# Altium footprint library 2.00-DIP-SOP、SOIC、ESOP、TSSOP、ETSSOP封装.PcbLib: 179 footprints (part 4 of 12)
Each footprint in its own frame and in the unit in brackets; x right, y up, seen from the top. Pads: shape width x height; smd on the part's side, far side on the other; paste and mask are expansions set on the pad; w line width, h text height; cw(c..) or ccw(c..) is an arc to the next point about the centre after c.
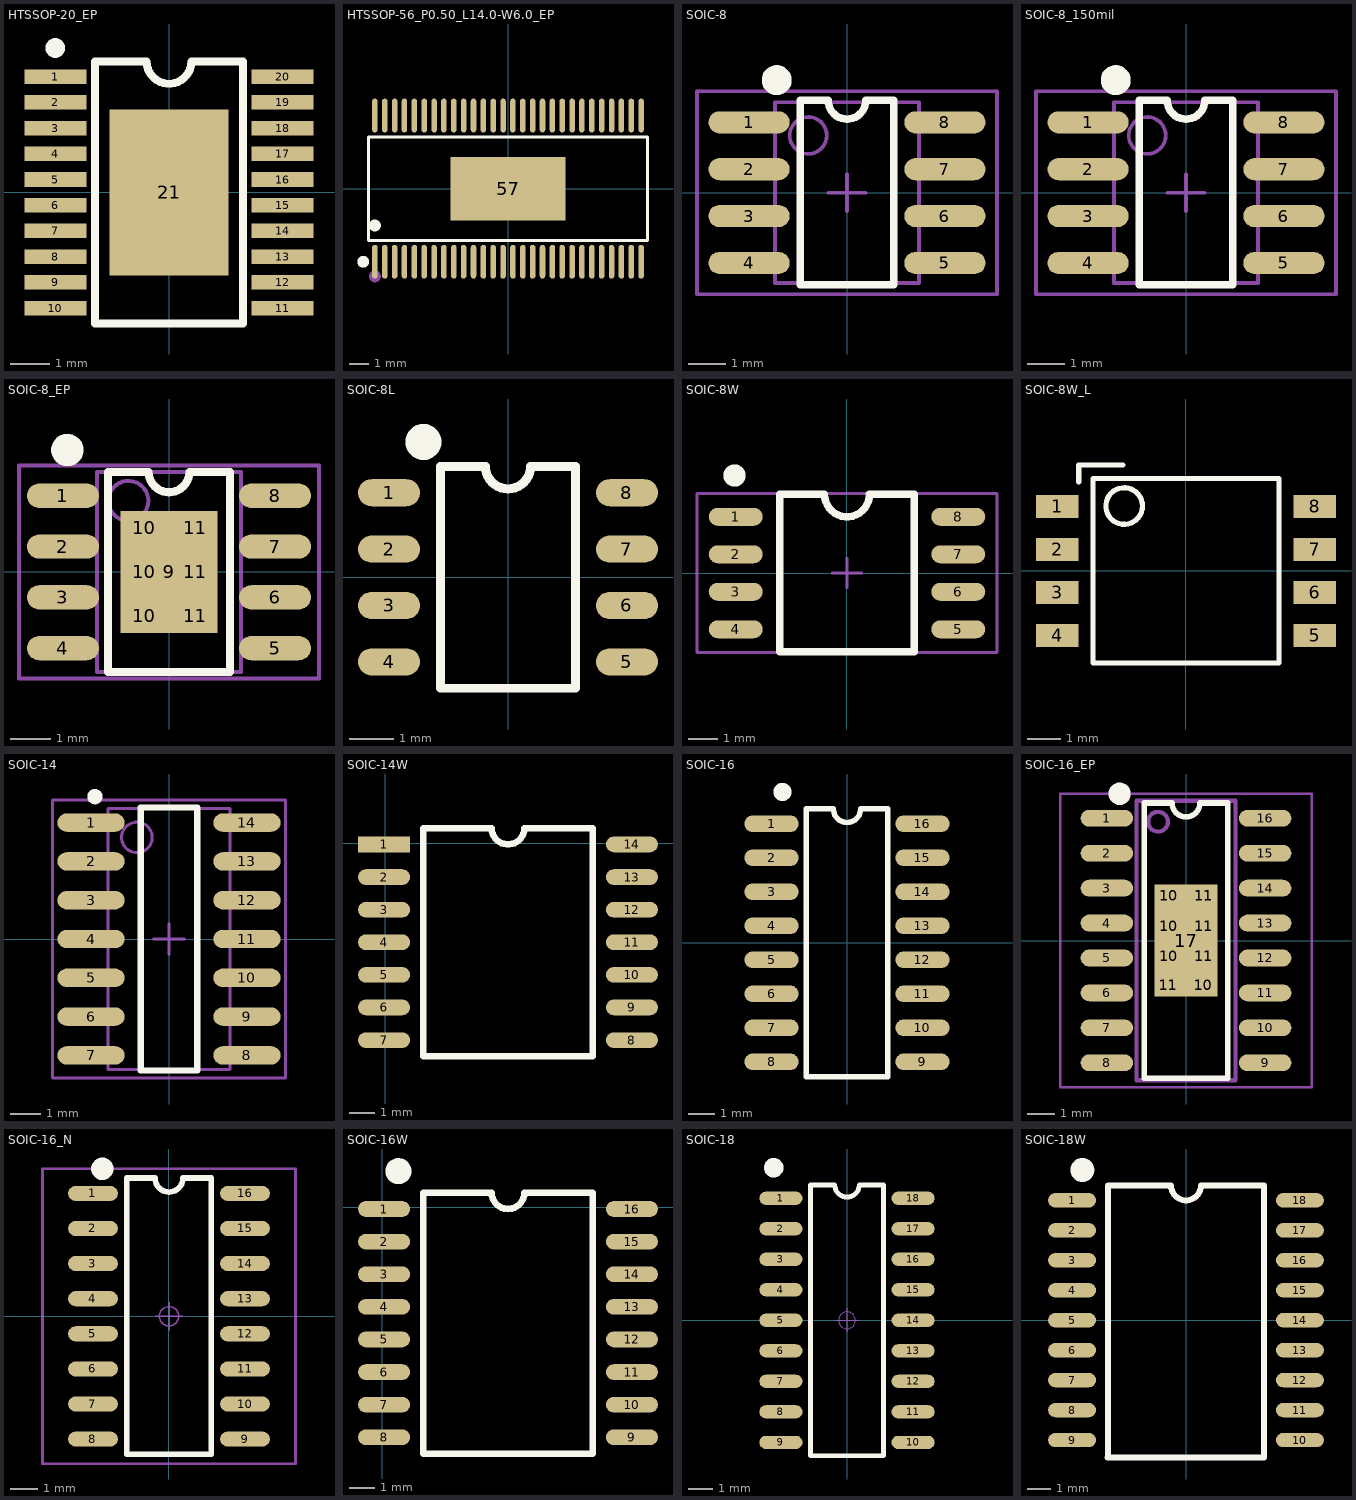
[diagram p3: the footprints below, top view; thin cyan lines are the x and y axes]

## HTSSOP-20_EP [mil] "HTSSOP-20_L6.5-W4.4-P0.65-LS6.4-BL-EP"
pads (21):
  rect 61.5x14.5 smd: 1(-113,115.16) 2(-113,89.57) 3(-113,63.98) 4(-113,38.39) 5(-113,12.8) 6(-113,-12.79) 7(-113,-38.39) 8(-113,-63.98) 9(-113,-89.57) 10(-113,-115.16) 11(113,-115.16) 12(113,-89.57) 13(113,-63.98) 14(113,-38.39) 15(113,-12.79) 16(113,12.8) 17(113,38.39) 18(113,63.98) 19(113,89.57) 20(113,115.16)
  rect 118.11x165.35 smd: 21(0,0)
Top Overlay:
  lines w7.9: -73.47,-130.31 -73.47,130.32 -22.28,130.32 ccw(c0,130.31) 22.3,130.32 73.48,130.32 73.48,-130.31 -73.47,-130.31
  lines w9.8: -108.3,143.6 cw(c-113.2,143.65) -108.3,143.7
3D body "TSSOP20.STEP": height 40.55, standoff -0.76, extent -126.06,-127.95 126.07,127.96

## HTSSOP-56_P0.50_L14.0-W6.0_EP [mm] "联系卖家 免费查找封装"
pads (57):
  oval 0.28x1.715 smd: 1(-6.75,-3.707) 2(-6.25,-3.707) 3(-5.75,-3.707) 4(-5.25,-3.707) 5(-4.75,-3.707) 6(-4.25,-3.707) 7(-3.75,-3.707) 8(-3.25,-3.707) 9(-2.75,-3.707) 10(-2.25,-3.707) 11(-1.75,-3.707) 12(-1.25,-3.707) 13(-0.75,-3.707) 14(-0.25,-3.707) 15(0.25,-3.707) 16(0.75,-3.707) 17(1.25,-3.707) 18(1.75,-3.707) 19(2.25,-3.707) 20(2.75,-3.707) 21(3.25,-3.707) 22(3.75,-3.707) 23(4.25,-3.707) 24(4.75,-3.707) 25(5.25,-3.707) 26(5.75,-3.707) 27(6.25,-3.707) 28(6.75,-3.707) 29(6.75,3.708) 30(6.25,3.708) 31(5.75,3.708) 32(5.25,3.708) 33(4.75,3.708) 34(4.25,3.708) 35(3.75,3.708) 36(3.25,3.708) 37(2.75,3.708) 38(2.25,3.708) 39(1.75,3.708) 40(1.25,3.708) 41(0.75,3.708) 42(0.25,3.708) 43(-0.25,3.708) 44(-0.75,3.708) 45(-1.25,3.708) 46(-1.75,3.708) 47(-2.25,3.708) 48(-2.75,3.708) 49(-3.25,3.708) 50(-3.75,3.708) 51(-4.25,3.708) 52(-4.75,3.708) 53(-5.25,3.708) 54(-5.75,3.708) 55(-6.25,3.708) 56(-6.75,3.708)
  rect 5.825x3.235 smd: 57(0,0)
Top Overlay:
  circle w0.3: c-6.75,-1.869 r0.15
  circle w0.3: c-7.342,-3.708 r0.15
  lines w0.152: -7.076,-2.621 -7.076,2.622 7.076,2.622 7.076,-2.621 -7.076,-2.621
Mechanical 15:
  circle w0.3: c-6.75,-4.45 r0.15
3D body: height 1, standoff 0.1, extent -7,-2.6 7,2.6

## SOIC-8 [mm]
height 1.75
pads (8):
  oval 2.2x0.6 smd: 1(-2.654,1.905) 2(-2.654,0.635) 3(-2.654,-0.635) 4(-2.654,-1.905) 5(2.654,-1.905) 6(2.654,-0.635) 7(2.654,0.635) 8(2.654,1.905)
Top Overlay:
  circle w0.5: c-1.905,3.048 r0.155
  lines w0.2: -1.27,2.5 -1.27,-2.5 1.27,-2.5 1.27,2.5 ; -0.9,-2.5 0.9,-2.5
  lines w0.203: -1.27,2.5 -0.508,2.5 ccw(c0,2.5) 0,1.992 ccw(c0,2.5) 0.508,2.5 1.27,2.5
Mechanical 13:
  circle w0.1: c-1.05,1.55 r0.5
  lines w0.1: -1.95,-2.45 -1.95,2.45 1.95,2.45 1.95,-2.45 -1.95,-2.45
Mechanical 15:
  lines w0.1: -0.5,0 0.5,0 ; 0,-0.5 0,0.5 ; -4.064,-2.75 -4.064,2.75 4.064,2.75 4.064,-2.75 -4.064,-2.75
3D body "SOP8.STEP": height 1.9, standoff 0, extent -3.003,-2.5 3.003,2.5

## SOIC-8_150mil [mm] "封装库来自淘宝卖家 ID：黄晶宝石"
height 1.75
pads (8):
  oval 2.2x0.6 smd: 1(-2.654,1.905) 2(-2.654,0.635) 3(-2.654,-0.635) 4(-2.654,-1.905) 5(2.654,-1.905) 6(2.654,-0.635) 7(2.654,0.635) 8(2.654,1.905)
Top Overlay:
  circle w0.5: c-1.905,3.048 r0.155
  lines w0.2: -1.27,2.5 -1.27,-2.5 1.27,-2.5 1.27,2.5 ; -0.9,-2.5 0.9,-2.5
  lines w0.203: -1.27,2.5 -0.508,2.5 ccw(c0,2.5) 0,1.992 ccw(c0,2.5) 0.508,2.5 1.27,2.5
Mechanical 13:
  circle w0.1: c-1.05,1.55 r0.5
  lines w0.1: -1.95,-2.45 -1.95,2.45 1.95,2.45 1.95,-2.45 -1.95,-2.45
Mechanical 15:
  lines w0.1: -0.5,0 0.5,0 ; 0,-0.5 0,0.5 ; -4.064,-2.75 -4.064,2.75 4.064,2.75 4.064,-2.75 -4.064,-2.75
3D body "SOP8.STEP": height 1.9, standoff 0, extent -3.003,-2.5 3.003,2.5

## SOIC-8_EP [mm] "5*6*1.8mm（长宽高)         联系卖家 免费查找封装"
height 1.75
pads (15):
  oval 1.8x0.61 smd: 1(-2.65,1.905) 2(-2.65,0.635) 3(-2.65,-0.635) 4(-2.65,-1.905) 5(2.65,-1.905) 6(2.65,-0.635) 7(2.65,0.635) 8(2.65,1.905)
  rect 2.413x3.048 smd paste-2: 9(0,0)
  rect 0.9x0.7 on Top Paste: 10(-0.625,-1.1) 10(-0.625,0) 10(-0.625,1.1) 11(0.65,-1.1) 11(0.65,0) 11(0.65,1.1)
Top Overlay:
  circle w0.5: c-2.54,3.048 r0.155
  lines w0.2: -1.524,2.5 -1.524,-2.5 1.524,-2.5 1.524,2.5
  lines w0.203: -1.524,2.5 -0.508,2.5 ccw(c0,2.5) 0,1.992 ccw(c0,2.5) 0.508,2.5 1.524,2.5
Mechanical 13:
  circle w0.1: c-1.016,1.778 r0.5
  lines w0.1: -1.8,-2.5 1.8,-2.5 1.8,2.5 -1.8,2.5 -1.8,-2.5
Mechanical 15:
  circle w0.05: c0,0 r0.35
  lines w0.05: -0.5,0 0.5,0 ; 0,-0.5 0,0.5
  lines w0.1: -3.75,-2.667 -3.75,2.667 3.75,2.667 3.75,-2.667 -3.75,-2.667
3D body "ESOP8.STEP": height 1.53, standoff -0.01, extent -3.003,-2.5 3.003,2.5

## SOIC-8L [mm] "联系卖家 免费查找封装"
pads (8):
  oval 1.397x0.61 smd: 1(-2.68,1.905) 2(-2.68,0.635) 3(-2.68,-0.635) 4(-2.68,-1.905) 5(2.68,-1.905) 6(2.68,-0.635) 7(2.68,0.635) 8(2.68,1.905)
Top Overlay:
  circle w0.5: c-1.905,3.048 r0.155
  lines w0.2: -1.524,2.5 -1.524,-2.5 1.524,-2.5 1.524,2.5 ; -0.9,-2.5 0.9,-2.5
  lines w0.203: -1.524,2.5 -0.508,2.5 ccw(c0,2.5) 0,1.992 ccw(c0,2.5) 0.508,2.5 1.524,2.5
3D body "SOP8.STEP": height 1.9, standoff 0, extent -3.003,-2.5 3.003,2.5

## SOIC-8W [mil] "25Q128 SPI_FLASH  SOIC8"
height 68.9
pads (8):
  oval 72x24 smd: 1(-148.35,75) 2(-148.35,25) 3(-148.35,-25) 4(-148.35,-75) 5(148.35,-75) 6(148.35,-25) 7(148.35,25) 8(148.35,75)
Top Overlay:
  circle w9.84: c-149.92,125 r4.92
  circle w19.68: c-150,130 r5
  lines w10: -90,-105 90,-105 90,105 30,105 cw(c0,105) -30,105 -90,105 -90,-105
Mechanical 15:
  lines w3.94: -19.68,0 19.69,0 ; 0,-19.68 0,19.68 ; -200,-106.3 -200,106.3 200,106.3 200,-106.3 -200,-106.3
3D body "SOP8E .STEP": height 74.8, standoff 0.03, extent -155.22,-103.93 155.23,103.94

## SOIC-8W_L [mm] "25Q128 SPI_FLASH  SOIC8  联系卖家 免费查找封装"
pads (8):
  rect 1.25x0.68 smd: 1(-3.805,1.905) 2(-3.805,0.635) 3(-3.805,-0.635) 4(-3.805,-1.905) 5(3.805,-1.905) 6(3.805,-0.635) 7(3.805,0.635) 8(3.805,1.905)
Top Overlay:
  circle w0.152: c-1.826,1.915 r0.541
  lines w0.152: -3.167,2.63 -3.167,3.13 -1.867,3.13 ; -2.75,-2.725 -2.75,2.725 2.75,2.725 2.75,-2.725 -2.75,-2.725
3D body "SOP8E .STEP": height 1.9, standoff 0, extent -3.943,-2.64 3.943,2.64

## SOIC-14 [mm] "联系卖家 免费查找封装"
height 1.75
pads (14):
  oval 2.2x0.6 smd: 1(-2.552,3.81) 2(-2.552,2.54) 3(-2.552,1.27) 4(-2.552,0) 5(-2.552,-1.27) 6(-2.552,-2.54) 7(-2.552,-3.81) 8(2.552,-3.81) 9(2.552,-2.54) 10(2.552,-1.27) 11(2.552,0) 12(2.552,1.27) 13(2.552,2.54) 14(2.552,3.81)
Top Overlay:
  circle w0.25: c-2.425,4.66 r0.125
  lines w0.2: -0.925,-4.3 0.925,-4.3 0.925,4.3 -0.925,4.3 -0.925,-4.3
Mechanical 13:
  circle w0.1: c-1.05,3.325 r0.5
  lines w0.1: -2,-4.275 2,-4.275 2,4.275 -2,4.275 -2,-4.275
Mechanical 15:
  lines w0.1: -0.5,0 0.5,0 ; 0,-0.5 0,0.5 ; -3.81,-4.55 3.81,-4.55 3.81,4.55 -3.81,4.55 -3.81,-4.55
3D body "SOP-14.STEP": height 1.9, standoff 0, extent -3.003,-4.35 3.003,4.35

## SOIC-14W [mil] "联系卖家 免费查找封装"
pads (14):
  rect 80x24 smd: 1(-2,-2)
  oval 80x24 smd: 2(-2,-52) 3(-2,-102) 4(-2,-152) 5(-2,-202) 6(-2,-252) 7(-2,-302) 8(378,-302) 9(378,-252) 10(378,-202) 11(378,-152) 12(378,-102) 13(378,-52) 14(378,-2)
Top Overlay:
  lines w10: 58,-327 318,-327 318,23 213,23 cw(c188,23) 163,23 58,23 58,-327

## SOIC-16 [mil] "联系卖家 免费查找封装"
pads (16):
  oval 80x24 smd: 1(-110.95,175) 2(-110.95,125) 3(-110.95,75) 4(-110.95,25) 5(-110.95,-25) 6(-110.95,-75) 7(-110.95,-125) 8(-110.95,-175) 9(110.95,-175) 10(110.95,-125) 11(110.95,-75) 12(110.95,-25) 13(110.95,25) 14(110.95,75) 15(110.95,125) 16(110.95,175)
Top Overlay:
  circle w18: c-95,221.81 r4.3
  lines w7.87: -60,196.85 -60,-196.85 60,-196.85 60,196.85
  lines w8: -60,196.85 -20,196.85 ccw(c0,196.85) 0,176.85 ccw(c0,196.85) 20,196.85 60,196.85
3D body "SOP16.STEP": height 74.8, standoff 0.03, extent -118.21,-196.85 118.23,196.86

## SOIC-16_EP [mm] "10.3*6.2*1.8mm（长宽高）联系卖家 免费查找封装"
height 1.75
pads (25):
  oval 1.905x0.61 smd: 1(-2.877,4.445) 2(-2.877,3.175) 3(-2.877,1.905) 4(-2.877,0.635) 5(-2.877,-0.635) 6(-2.877,-1.905) 7(-2.877,-3.175) 8(-2.877,-4.445) 9(2.877,-4.445) 10(2.877,-3.175) 11(2.877,-1.905) 12(2.877,-0.635) 13(2.877,0.635) 14(2.877,1.905) 15(2.877,3.175) 16(2.877,4.445)
  rect 0.9x0.7 on Top Paste: 10(-0.625,-0.575) 10(-0.625,0.525) 10(-0.625,1.625) 10(0.625,-1.625) 11(-0.65,-1.625) 11(0.65,-0.575) 11(0.65,0.525) 11(0.65,1.625)
  rect 2.286x4.064 smd paste-3: 17(0,0)
Top Overlay:
  circle w0.5: c-2.413,5.334 r0.155
  lines w0.2: -1.524,5 -1.524,-5 1.524,-5 1.524,5
  lines w0.203: -1.524,5 -0.508,5 ccw(c0,5) 0,4.492 ccw(c0,5) 0.508,5 1.524,5
Mechanical 13:
  circle w0.15: c-1.016,4.318 r0.359
  lines w0.15: -1.8,-5.08 1.8,-5.08 1.8,5.08 -1.8,5.08 -1.8,-5.08
Mechanical 15:
  circle w0.05: c0,0 r0.35
  lines w0.05: -0.5,0 0.5,0 ; 0,-0.5 0,0.5
  lines w0.1: -4.572,-5.334 4.572,-5.334 4.572,5.334 -4.572,5.334 -4.572,-5.334
3D body "ESOP16 .STEP": height 1.53, standoff -0.03, extent -3.003,-5 3.003,5

## SOIC-16_N [mm] "10.3*6.2*1.8mm（长宽高）"
height 1.75
pads (16):
  oval 1.8x0.55 smd: 1(-2.75,4.445) 2(-2.75,3.175) 3(-2.75,1.905) 4(-2.75,0.635) 5(-2.75,-0.635) 6(-2.75,-1.905) 7(-2.75,-3.175) 8(-2.75,-4.445) 9(2.75,-4.445) 10(2.75,-3.175) 11(2.75,-1.905) 12(2.75,-0.635) 13(2.75,0.635) 14(2.75,1.905) 15(2.75,3.175) 16(2.75,4.445)
Top Overlay:
  circle w0.5: c-2.413,5.334 r0.155
  lines w0.2: -1.524,5 -1.524,-5 1.524,-5 1.524,5
  lines w0.203: -1.524,5 -0.508,5 ccw(c0,5) 0,4.492 ccw(c0,5) 0.508,5 1.524,5
Mechanical 15:
  circle w0.05: c0,0 r0.35
  lines w0.05: -0.5,0 0.5,0 ; 0,-0.5 0,0.5
  lines w0.1: -4.572,-5.334 -4.572,5.334 4.572,5.334 4.572,-5.334 -4.572,-5.334
3D body "SOP16.STEP": height 1.9, standoff 0, extent -3.003,-5 3.003,5

## SOIC-16W [mil] "联系卖家 免费查找封装"
pads (16):
  oval 80x24 smd: 1(3,-3) 2(3,-53) 3(3,-103) 4(3,-153) 5(3,-203) 6(3,-253) 7(3,-303) 8(3,-353) 9(383,-353) 10(383,-303) 11(383,-253) 12(383,-203) 13(383,-153) 14(383,-103) 15(383,-53) 16(383,-3)
Top Overlay:
  circle w20: c25,55 r10
  lines w10: 167.72,22 63,22 63,-378 323,-378 323,22 218,22 cw(c193,22) 168,22
3D body "SOP16W.STEP": height 106.3, standoff 0.03, extent -6.01,-379.92 399.73,25.59

## SOIC-18 [mm] "11.5*6.2*1.8mm（长宽高）"
height 1.75
pads (18):
  oval 1.8x0.55 smd: 1(-2.75,5.08) 2(-2.75,3.81) 3(-2.75,2.54) 4(-2.75,1.27) 5(-2.75,0) 6(-2.75,-1.27) 7(-2.75,-2.54) 8(-2.75,-3.81) 9(-2.75,-5.08) 10(2.75,-5.08) 11(2.75,-3.81) 12(2.75,-2.54) 13(2.75,-1.27) 14(2.75,0) 15(2.75,1.27) 16(2.75,2.54) 17(2.75,3.81) 18(2.75,5.08)
Top Overlay:
  circle w0.5: c-3.048,6.35 r0.155
  lines w0.2: -1.524,5.635 -1.524,-5.635 1.524,-5.635 1.524,5.635
  lines w0.203: -1.524,5.635 -0.508,5.635 ccw(c0,5.635) 0,5.127 ccw(c0,5.635) 0.508,5.635 1.524,5.635
Mechanical 15:
  circle w0.05: c0,0 r0.35
  lines w0.05: -0.5,0 0.5,0 ; 0,-0.5 0,0.5
3D body "SOP18.STEP": height 1.9, standoff 0, extent -3.003,-5.75 3.003,5.75

## SOIC-18W [mil] "联系卖家 免费查找封装"
pads (18):
  oval 80x24 smd: 1(-190,200) 2(-190,150) 3(-190,100) 4(-190,50) 5(-190,0) 6(-190,-50) 7(-190,-100) 8(-190,-150) 9(-190,-200) 10(190,-200) 11(190,-150) 12(190,-100) 13(190,-50) 14(190,0) 15(190,50) 16(190,100) 17(190,150) 18(190,200)
Top Overlay:
  circle w20: c-172.98,250.64 r10
  lines w10: -131,-229 129,-229 ; -130,-229 -130,225 -25,225 ccw(c0,225) 25,225 130,225 130,-229
3D body "SOP18w.STEP": height 106.3, standoff 0.03, extent -202.86,-226.37 202.87,226.38